# Altium footprint library 声源跟踪小车原封装库.PcbLib: 38 footprints (part 1 of 3)
Each footprint in its own frame and in the unit in brackets; x right, y up, seen from the top. Pads: shape width x height; smd on the part's side, far side on the other; paste and mask are expansions set on the pad; w line width, h text height; cw(c..) or ccw(c..) is an arc to the next point about the centre after c.
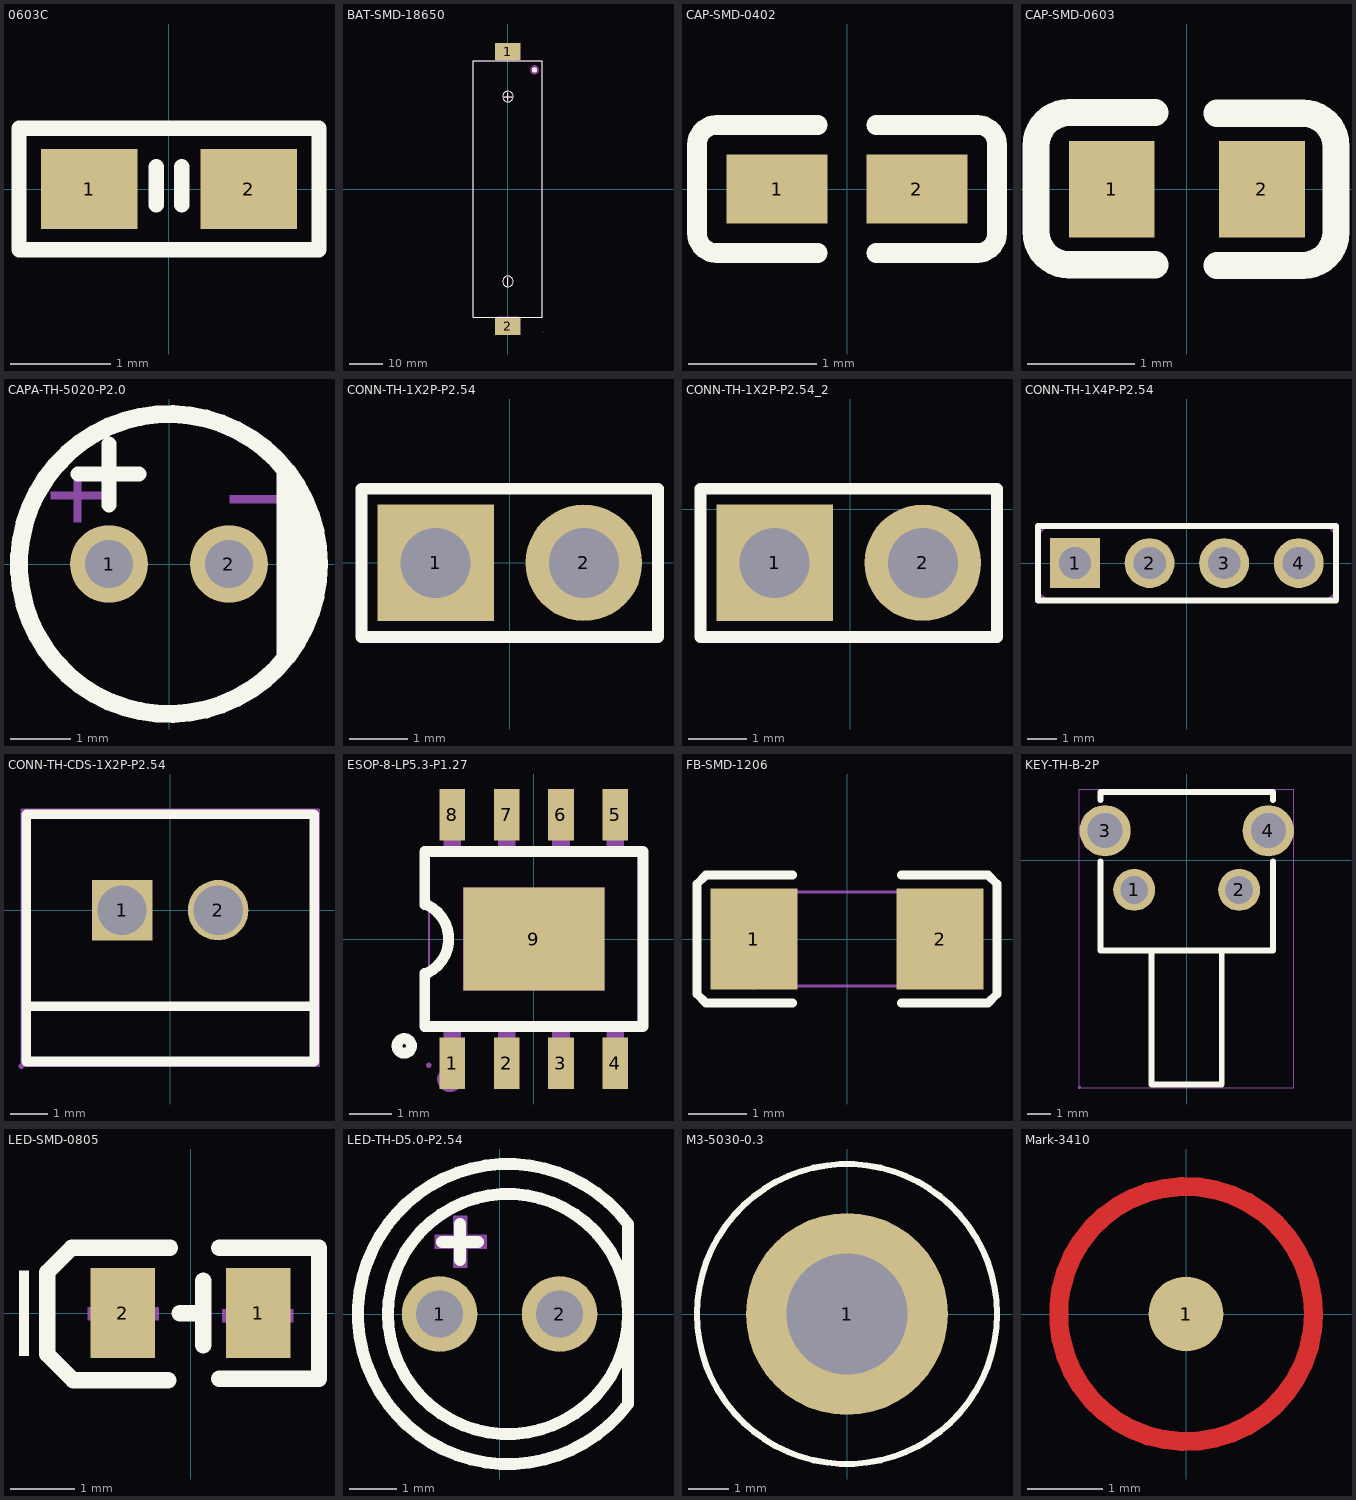
[diagram p0: the footprints below, top view; thin cyan lines are the x and y axes]

## 0603C [mm]
pads (2):
  rect 0.965x0.8 smd: 1(-0.8,0) 2(0.8,0)
Top Overlay:
  lines w0.152: -0.127,-0.159 -0.127,0.222 ; 0.127,-0.159 0.127,0.222 ; -1.502,-0.608 -0.8,-0.608 0.208,-0.608 1.502,-0.608 1.502,0.4 1.502,0.608 0.8,0.608 -0.208,0.608 -1.502,0.608 -1.502,-0.4 -1.502,-0.608

## BAT-SMD-18650 [mil] "BATTERY-SMD_18650-1S-L77.1-W20.7-1"
pads (2):
  rect 300x200 smd mask+2: 1(0,1626.5) 2(0,-1626.5)
Top Overlay:
  circle w30.95: c314.96,1411.02 r15.47
  circle w10: c0,1095 r63
  circle w10: c0,-1095 r63
  lines w10: -45,1095 45,1095 ; 0,-1140 0,-1050 ; 0,1050 0,1140 ; -407.5,-1517.5 407.5,-1517.5 407.5,1517.5 -407.5,1517.5 -407.5,-1517.5
Keep-Out Layer:
  board cut-out: 362.2,1411.02 362.2,1417.24 358.98,1429.26 352.76,1440.03 343.97,1448.82 333.2,1455.04 321.18,1458.26 308.74,1458.26 296.72,1455.04 285.95,1448.82 277.16,1440.03 270.94,1429.26 267.72,1417.24 267.72,1411.02 267.72,1404.8 270.94,1392.78 277.16,1382.01 285.95,1373.22 296.72,1367 308.74,1363.78 321.18,1363.78 333.2,1367 343.97,1373.22 352.76,1382.01 358.98,1392.78 362.2,1404.8
Mechanical 2:
  circle w0.2: c314.96,1411.02 r47.24
  region: -125,-1512.5 -125,-1693.5 125,-1693.5 125,-1512.5
  region: -125,1693.5 -125,1516.5 125,1516.5 125,1691.5
  region: 49.6,1079.81 49.6,1089.81 -50.4,1089.81 -50.4,1079.81
  region: 5.42,1135.07 -4.58,1135.07 -4.58,1035.07 5.42,1035.07
  region: 4.98,-1045.59 -5.02,-1045.59 -5.02,-1145.59 4.98,-1145.59
  region: 409.84,-1693.5 409.84,-1692.52 408.46,-1691.14 406.5,-1691.14 405.12,-1692.52 405.12,-1693.5 405.12,-1694.48 406.5,-1695.86 408.46,-1695.86 409.84,-1694.48
  lines w2: -407.5,-1516.73 -407.5,1516.73 407.48,1516.73 407.48,-1516.73 -407.5,-1516.73
3D body "BAT-SMD-18650.step": height 585.97, standoff -62.06, extent -401.5,-1701.5 411.89,1685.5
3D body "Battery_18650.STEP": height 724.33, standoff 15.67, extent -354.12,-1294 352.12,1265.06

## CAP-SMD-0402 [mm] "贴片电容0402"
pads (2):
  rect 0.79x0.54 smd: 1(-0.545,0) 2(0.545,0)
Top Overlay:
  lines w0.152: -0.226,-0.499 -1.016,-0.499 cw(c-1.016,-0.346) -1.169,-0.346 -1.169,0.346 cw(c-1.016,0.346) -1.016,0.499 -0.226,0.499 ; 0.226,-0.499 1.016,-0.499 ccw(c1.016,-0.346) 1.169,-0.346 1.169,0.346 ccw(c1.016,0.346) 1.016,0.499 0.226,0.499
Top Paste:
  region: 0.78,0.225 0.78,-0.225 0.73,-0.275 0.25,-0.275 0.18,-0.225 0.18,0.225 0.25,0.275 0.73,0.275
  region: -0.18,0.225 -0.18,-0.225 -0.25,-0.275 -0.73,-0.275 -0.78,-0.225 -0.78,0.225 -0.73,0.275 -0.25,0.275
3D body "CAP-SMD-0402.step": height 0.5, standoff 0, extent -0.5,-0.25 0.5,0.25

## CAP-SMD-0603 [mm] "贴片电容0603"
pads (2):
  rect 0.8x0.9 smd: 1(-0.7,0) 2(0.7,0)
Top Overlay:
  lines w0.254: -0.296,-0.704 -1.096,-0.704 cw(c-1.096,-0.394) -1.406,-0.394 -1.405,0.406 cw(c-1.096,0.406) -1.096,0.715 -0.296,0.715 ; 0.28,-0.71 1.08,-0.71 ccw(c1.08,-0.4) 1.39,-0.4 1.39,0.4 ccw(c1.08,0.4) 1.08,0.71 0.28,0.71
3D body "CAP-SMD-0603.step": height 0.8, standoff 0, extent -0.8,-0.4 0.8,0.4

## CAPA-TH-5020-P2.0 [mm] "插件电解电容CAP-TH_BD5.0-P2.00-D0.8-FD"
pads (2):
  round 1.3 hole 0.8: 1(-1,0) 2(1,0)
Top Overlay:
  circle w0.3: c0,0 r2.5
  region: 1.794,1.651 1.961,1.491 2.225,1.111 2.407,0.685 2.5,0.231 2.5,-0.231 2.407,-0.685 2.225,-1.111 1.961,-1.491 1.794,-1.651
  lines w0.254: -1.516,1.5 -0.5,1.5 ; -1,0.984 -1,2
Mechanical 2:
  region: 1.016,1.143 1.905,1.143 1.905,1.016 1.016,1.016
  region: -1.588,0.699 -1.588,1.587 -1.461,1.587 -1.46,0.699
  region: -1.969,1.206 -1.08,1.206 -1.08,1.079 -1.969,1.079
3D body "CAPA-TH-5020-P2.0.step": height 5, standoff -2, extent -2.5,-2.498 2.5,2.499

## CONN-TH-1X2P-P2.54 [mm] "HDR-TH_2P-P2.54-V-M"
pads (2):
  rect 1.999x1.999 hole 1.199 mask+0.051: 1(-1.27,0)
  round 1.999 hole 1.199 mask+0.051: 2(1.27,0)
Top Overlay:
  lines w0.203: -2.54,-1.27 2.54,-1.27 2.54,1.27 -0.635,1.27 -2.54,1.27 -2.54,-1.27
Mechanical 2:
  region: -2.479,-1.25 -2.479,-1.224 -2.515,-1.189 -2.565,-1.189 -2.601,-1.224 -2.601,-1.25 -2.601,-1.275 -2.565,-1.311 -2.515,-1.311 -2.479,-1.275
  region: 0.95,0.32 1.59,0.32 1.59,-0.32 0.95,-0.32
  region: -1.59,0.32 -0.95,0.32 -0.95,-0.32 -1.59,-0.32
  lines w0.051: -2.54,-1.25 -2.54,1.25 2.54,1.25 2.54,-1.25 -2.54,-1.25
3D body "CONN-TH-1X2P-P2.54.step": height 8.5, standoff -3, extent -2.54,-1.27 2.54,1.27

## CONN-TH-1X2P-P2.54_2 [mil]
pads (2):
  rect 78.7x78.7 hole 47.2 mask+2: 1(-51,-36)
  round 78.7 hole 47.2 mask+2: 2(49,-36)
Top Overlay:
  lines w8: -101,-86 99,-86 99,14 -26,14 -101,14 -101,-86
Mechanical 2:
  region: 36.4,-23.4 61.6,-23.4 61.6,-48.6 36.4,-48.6
  region: -63.6,-23.4 -38.4,-23.4 -38.4,-48.6 -63.6,-48.6
  region: -98.6,-85.2 -98.6,-84.21 -100.01,-82.8 -101.99,-82.8 -103.4,-84.21 -103.4,-85.2 -103.4,-86.19 -101.99,-87.6 -100.01,-87.6 -98.6,-86.19
  lines w2: -101,-85.2 -101,13.2 99,13.2 99,-85.2 -101,-85.2
3D body "MIC-TH-BD6.0-P1.90.step": height 113.32, standoff -109.12, extent -118.22,-118.31 118,118.31

## CONN-TH-1X4P-P2.54 [mm] "HDR-TH_4P-P2.54-V-M-1"
pads (4):
  rect 1.699x1.699 hole 1.1 mask+0.051: 1(-3.81,0)
  round 1.699 hole 1.1 mask+0.051: 2(-1.27,0) 3(1.27,0) 4(3.81,0)
Top Overlay:
  lines w0.203: -5.08,-1.27 5.08,-1.27 5.08,1.27 -3.175,1.27 -5.08,1.27 -5.08,-1.27
Mechanical 2:
  region: -5.019,-1.27 -5.019,-1.245 -5.055,-1.209 -5.105,-1.209 -5.141,-1.245 -5.141,-1.27 -5.141,-1.295 -5.105,-1.331 -5.055,-1.331 -5.019,-1.295
  region: -4.13,0.32 -3.49,0.32 -3.49,-0.32 -4.13,-0.32
  region: -1.59,0.32 -0.95,0.32 -0.95,-0.32 -1.59,-0.32
  region: 0.95,0.32 1.59,0.32 1.59,-0.32 0.95,-0.32
  region: 3.49,0.32 4.13,0.32 4.13,-0.32 3.49,-0.32
  lines w0.051: -5.08,-0.97 -4.78,-1.27 4.78,-1.27 5.08,-0.97 5.08,0.97 4.78,1.27 -4.78,1.27 -5.08,0.97 -5.08,-0.97
3D body "CONN-TH-1X4P-P2.54.step": height 8.54, standoff -3, extent -5.08,-1.27 5.08,1.27

## CONN-TH-CDS-1X2P-P2.54 [mil] "CONN-TH_2P-P2.54_CDS-2P"
pads (2):
  rect 63x63 hole 51.2 mask+2: 1(-50,0)
  round 63 hole 51.2 mask+2: 2(50,0)
Top Overlay:
  lines w10: -150,-100 -150,-157.5 150,-157.5 150,-100 ; -150,-100 -150,100 150,100 150,-100 ; -150,-100 150,-100
Mechanical 2:
  region: -152.6,-162.5 -152.6,-161.51 -154.01,-160.1 -155.99,-160.1 -157.4,-161.51 -157.4,-162.5 -157.4,-163.49 -155.99,-164.9 -154.01,-164.9 -152.6,-163.49
  region: -28.3,0 -28.3,4.32 -31.6,12.29 -37.71,18.4 -45.68,21.7 -54.32,21.7 -62.29,18.4 -68.4,12.29 -71.7,4.32 -71.7,0 -71.7,-4.32 -68.4,-12.29 -62.29,-18.4 -54.32,-21.7 -45.68,-21.7 -37.71,-18.4 -31.6,-12.29 -28.3,-4.32
  region: 71.7,0 71.7,4.32 68.4,12.29 62.29,18.4 54.32,21.7 45.68,21.7 37.71,18.4 31.6,12.29 28.3,4.32 28.3,0 28.3,-4.32 31.6,-12.29 37.71,-18.4 45.68,-21.7 54.32,-21.7 62.29,-18.4 68.4,-12.29 71.7,-4.32
  lines w2: -155,-162.5 -155,105 155,105 155,-162.5 -155,-162.5
3D body "CONN-TH-CDS-1x2P-P2.54.step": height 470.46, standoff -131.91, extent -150,-165.4 150.04,110.2

## ESOP-8-LP5.3-P1.27 [mm] "ESOP-8_L4.9-W3.9-P1.27-LS6.0-BL-EP"
pads (9):
  rect 0.6x1.2 smd mask+0.051: 1(-1.905,-2.908) 2(-0.635,-2.908) 3(0.635,-2.908) 4(1.905,-2.908) 5(1.905,2.908) 6(0.635,2.908) 7(-0.635,2.908) 8(-1.905,2.908)
  rect 3.3x2.4 smd mask+0.051: 9(0,0)
Top Overlay:
  circle w0.254: c-3.03,-2.5 r0.17
  lines w0.254: -2.55,-0.8 -2.55,-2.05 2.55,-2.05 2.55,2.05 -2.55,2.05 -2.55,0.8 ; -2.5,-0.8 ccw(c-2.875,0) -2.5,0.8
Mechanical 2:
  circle w0.3: c-1.96,-3.28 r0.15
  region: -2.105,2.3 -2.105,2.95 -1.705,2.95 -1.705,2.3
  region: -0.835,2.3 -0.835,2.95 -0.435,2.95 -0.435,2.3
  region: 0.435,2.3 0.435,2.95 0.835,2.95 0.835,2.3
  region: 1.705,2.3 1.705,2.95 2.105,2.95 2.105,2.3
  region: -2.105,1.94 -2.105,2.31 -1.705,2.31 -1.705,1.94
  region: -0.835,1.94 -0.835,2.31 -0.435,2.31 -0.435,1.94
  region: 1.705,1.94 1.705,2.31 2.105,2.31 2.105,1.94
  region: 0.435,1.94 0.435,2.31 0.835,2.31 0.835,1.94
  region: 1.65,-1.2 -1.65,-1.2 -1.65,1.2 1.65,1.2
  region: -2.105,-2.31 -2.105,-1.94 -1.705,-1.94 -1.705,-2.31
  region: -0.835,-2.31 -0.835,-1.94 -0.435,-1.94 -0.435,-2.31
  region: 0.435,-2.31 0.435,-1.94 0.835,-1.94 0.835,-2.31
  region: 1.705,-2.31 1.705,-1.94 2.105,-1.94 2.105,-2.31
  region: 0.435,-2.95 0.435,-2.3 0.835,-2.3 0.835,-2.95
  region: -2.105,-2.95 -2.105,-2.3 -1.705,-2.3 -1.705,-2.95
  region: -0.835,-2.95 -0.835,-2.3 -0.435,-2.3 -0.435,-2.95
  region: 1.705,-2.95 1.705,-2.3 2.105,-2.3 2.105,-2.95
  region: -2.394,-2.95 -2.394,-2.925 -2.429,-2.89 -2.479,-2.89 -2.514,-2.925 -2.514,-2.95 -2.514,-2.975 -2.479,-3.01 -2.429,-3.01 -2.394,-2.975
  lines w0.051: -2.45,-1.95 -2.45,1.95 2.45,1.95 2.45,-1.95 -2.45,-1.95
3D body "ESOP-8-LP5.3-P1.27.step": height 1.68, standoff -0.02, extent -2.445,-3.05 2.45,3.05

## FB-SMD-1206 [mil] "贴片磁珠1206"
pads (2):
  rect 58.5x68 smd mask+2: 1(-62.7,0) 2(62.7,0)
Top Overlay:
  lines w6: -36.5,-43 -94.9,-43 -100.9,-37 -100.9,37 -94.9,43 -36.5,43 ; 36.5,-43 94.9,-43 100.9,-37 100.9,37 94.9,43 36.5,43
Top Paste:
  region: 33.5,-30.1 33.5,-15.5 37.4,-11.6 49.4,-11.6 53.3,-7.6 53.3,7.6 49.4,11.6 37.4,11.6 33.5,15.5 33.5,30.1 37.4,34 88,34 91.9,30.1 91.9,-30.1 88,-34 37.4,-34
  region: -33.5,-30.1 -33.5,-15.5 -37.4,-11.6 -49.4,-11.6 -53.3,-7.6 -53.3,7.6 -49.4,11.6 -37.4,11.6 -33.5,15.5 -33.5,30.1 -37.4,34 -88,34 -91.9,30.1 -91.9,-30.1 -88,-34 -37.4,-34
Mechanical 1:
  region: -63,-31.5 -63,31.5 -43.3,31.5 -43.3,-31.5
  region: 63,-31.5 63,31.5 43.3,31.5 43.3,-31.5
  region: -60.6,-31.5 -60.6,-30.51 -62.01,-29.1 -63.99,-29.1 -65.4,-30.51 -65.4,-31.5 -65.4,-32.49 -63.99,-33.9 -62.01,-33.9 -60.6,-32.49
  lines w2: -63,-31.5 -63,31.5 63,31.5 63,-31.5 -63,-31.5
3D body "FB-SMD-1206.step": height 43.3, standoff -0.01, extent -62.99,-31.42 62.99,31.42

## KEY-TH-B-2P [mm] "KEY-TH_PTS645VXX83XLFS"
pads (4):
  round 1.801 hole 1.199 mask+0.051: 1(-2.25,-1.27) 2(2.25,-1.27)
  round 2.2 hole 1.501 mask+0.051: 3(-3.5,1.27) 4(3.5,1.27)
Top Overlay:
  lines w0.254: -3.701,-0.046 -3.701,-3.871 3.701,-3.871 3.701,-0.046 ; -3.701,2.586 -3.701,2.931 3.701,2.931 3.701,2.586 ; -1.501,-3.871 -1.501,-9.619 1.501,-9.619 1.501,-3.871
Mechanical 2:
  region: -1.75,-1.27 -1.75,-1.17 -1.826,-0.987 -1.967,-0.846 -2.151,-0.77 -2.35,-0.77 -2.534,-0.846 -2.675,-0.987 -2.751,-1.17 -2.751,-1.27 -2.751,-1.37 -2.675,-1.553 -2.534,-1.694 -2.35,-1.77 -2.151,-1.77 -1.967,-1.694 -1.826,-1.553 -1.75,-1.37
  region: 2.751,-1.27 2.751,-1.17 2.675,-0.987 2.534,-0.846 2.35,-0.77 2.151,-0.77 1.967,-0.846 1.826,-0.987 1.75,-1.17 1.75,-1.27 1.75,-1.37 1.826,-1.553 1.967,-1.694 2.151,-1.77 2.35,-1.77 2.534,-1.694 2.675,-1.553 2.751,-1.37
  region: 4.15,1.27 4.15,1.356 4.106,1.521 4.02,1.669 3.899,1.79 3.751,1.876 3.586,1.92 3.415,1.92 3.249,1.876 3.101,1.79 2.98,1.669 2.894,1.521 2.85,1.356 2.85,1.27 2.85,1.184 2.894,1.019 2.98,0.871 3.101,0.75 3.249,0.664 3.415,0.62 3.586,0.62 3.751,0.664 3.899,0.75 4.02,0.871 4.106,1.019 4.15,1.184
  region: -2.85,1.27 -2.85,1.356 -2.894,1.521 -2.98,1.669 -3.101,1.79 -3.249,1.876 -3.415,1.92 -3.586,1.92 -3.751,1.876 -3.899,1.79 -4.02,1.669 -4.106,1.521 -4.15,1.356 -4.15,1.27 -4.15,1.184 -4.106,1.019 -4.02,0.871 -3.899,0.75 -3.751,0.664 -3.586,0.62 -3.415,0.62 -3.249,0.664 -3.101,0.75 -2.98,0.871 -2.894,1.019 -2.85,1.184
  region: -4.539,-9.746 -4.539,-9.721 -4.575,-9.685 -4.625,-9.685 -4.661,-9.721 -4.661,-9.746 -4.661,-9.771 -4.625,-9.807 -4.575,-9.807 -4.539,-9.771
  lines w0.051: -4.6,-9.746 4.6,-9.746 4.6,3.058 -4.6,3.058 -4.6,-9.746
3D body "KEY-TH-B-2P.step": height 7.37, standoff -3.5, extent -4.179,-9.475 4.184,2.875

## LED-SMD-0805 [mm] "贴片LED灯0805"
pads (2):
  rect 1x1.4 smd: 1(1.05,0) 2(-1.05,0)
Top Overlay:
  region: -2.507,-0.66 -2.507,0.66 -2.66,0.66 -2.66,-0.66
  lines w0.254: -0.344,-1.043 -1.817,-1.043 -2.224,-0.636 -2.224,0.634 -1.843,1.015 -0.319,1.015 ; -0.169,0 0.1,0 ; 0.2,-0.5 0.2,0.5 ; 0.443,-1.017 1.993,-1.017 1.993,1.015 0.443,1.015
Mechanical 2:
  region: 0.941,-0.556 0.941,0.544 1.141,0.544 1.141,-0.556
  region: 0.494,0.06 1.594,0.06 1.594,-0.14 0.494,-0.14
  region: -0.494,-0.109 -1.594,-0.109 -1.594,0.091 -0.494,0.091
3D body "LED-SMD-0805.step": height 1.1, standoff 0, extent -1,-0.625 1,0.625

## LED-TH-D5.0-P2.54 [mm] "插件LED灯D5.0-LED-TH_BD5.0-P2.54-FD"
pads (2):
  round 1.6 hole 1: 1(-1.27,0) 2(1.27,0)
Top Overlay:
  circle w0.254: c0.178,0 r2.54
  lines w0.254: -1.219,1.524 -0.457,1.524 ; -0.838,1.143 -0.838,1.905 ; 2.718,-1.905 cw(c0.178,0) 2.718,1.905 2.718,-1.905
Mechanical 2:
  region: -1.372,1.682 -0.272,1.682 -0.272,1.382 -1.372,1.382
  region: -0.98,0.983 -0.98,2.083 -0.68,2.083 -0.68,0.983
3D body "LED-TH-D5.0-P2.54.step": height 11.6, standoff -2.5, extent -2.5,-2.9 2.9,2.9

## M3-5030-0.3 [mm]
pads (1):
  round 5 hole 3: 1(0,0)
Top Overlay:
  circle w0.152: c0,0 r3.709

## Mark-3410 [mm] "光学定位点"
pads (2):
  round 1 smd mask+0.102: 1(0,0)
  round 4 on Top Solder: 1(0,0)
Top Layer:
  circle w0.254: c0,0 r1.7
  circle w0.254: c0,0 r1.7